# Altium footprint library pcb.PcbLib: 397 footprints (part 10 of 25)
Each footprint in its own frame and in the unit in brackets; x right, y up, seen from the top. Pads: shape width x height; smd on the part's side, far side on the other; paste and mask are expansions set on the pad; w line width, h text height; cw(c..) or ccw(c..) is an arc to the next point about the centre after c.
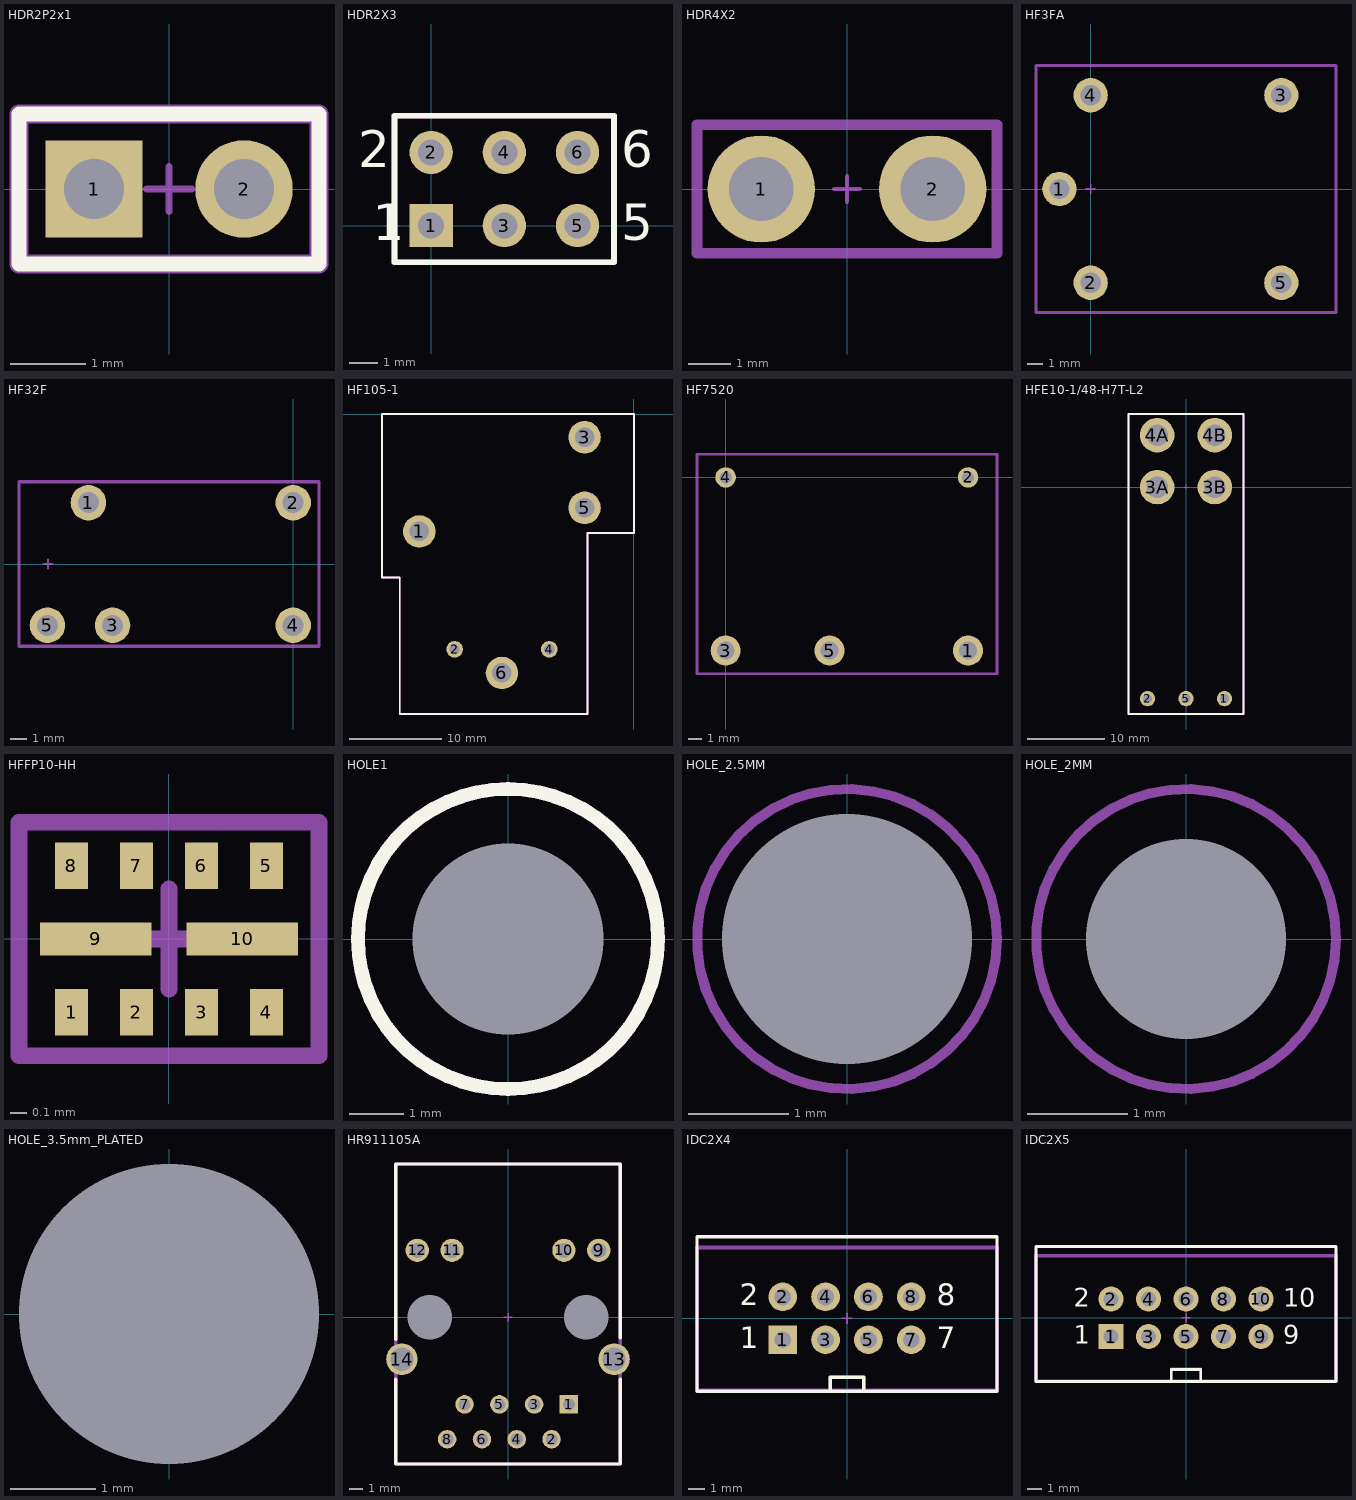
[diagram p9: the footprints below, top view; thin cyan lines are the x and y axes]

## HDR2P2x1 [mm] "Connector; Header; 2 Position"
height 2.38
pads (2):
  rect 1.3x1.3 hole 0.8: 1(-1,0)
  round 1.3 hole 0.8: 2(1,0)
Top Overlay:
  lines w0.2: -2,-1 2,-1 2,1 -2,1 -2,-1
Mechanical 15:
  lines w0.1: -0.3,0 0.3,0 ; 0,-0.3 0,0.3
  lines w0.254: -2,-1 2,-1 2,1 -2,1 -2,-1
  text ".Designator" at -1.778,-0.66 h1.02

## HDR2X3 [mm] "Connector; Header; 3x2 Position"
height 1
pads (6):
  rect 1.5x1.5 hole 0.9: 1(0,0)
  round 1.5 hole 0.9: 2(0,2.54) 3(2.54,0) 4(2.54,2.54) 5(5.08,0) 6(5.08,2.54)
Top Overlay:
  lines w0.2: 1.482,-1.27 6.35,-1.27 ; 6.35,-1.27 6.35,3.81 -1.27,3.81 -1.27,-1.27 6.35,-1.27
  text "6" at 6.604,2.032 h1.27
  text "5" at 6.604,-0.508 h1.27
  text "2" at -2.54,2.032 h1.27
  text "1" at -2.032,-0.508 h1.27
Mechanical 15:
  lines w0.1: -0.3,0 0.3,0 ; 0,-0.3 0,0.3
  lines w0.2: -1.27,-1.27 -1.27,3.81 6.35,3.81 6.35,-1.27 -1.27,-1.27
  text ".Designator" at 0,1.27 h1.02
3D body "TSW-103-05-G-D.stp": height 5.21, standoff -3.3, extent -1.26,-1.24 6.36,3.84

## HDR4X2 [mm]
height 2
pads (2):
  round 2.5 hole 1.5: 1(-2,0) 2(2,0)
Mechanical 15:
  lines w0.1: -0.3,0 0.3,0 ; 0,-0.3 0,0.3
  lines w0.254: -2.9,0 -2.5,0 ; 2.5,0 2.9,0 ; -3.5,-1.5 3.5,-1.5 3.5,1.5 -3.5,1.5 -3.5,-1.5
  text ".Designator" at -3.5,2 h1.02

## HF3FA [mm]
height 15.5
pads (5):
  round 2.2 hole 1.3: 1(-2,0) 2(0,-6) 3(12.2,6) 4(0,6) 5(12.2,-6)
Mechanical 15:
  lines w0.1: -0.3,0 0.3,0 ; 0,-0.3 0,0.3
  lines w0.2: -3.5,-7.9 15.7,-7.9 15.7,7.9 -3.5,7.9 -3.5,-7.9
  text ".Designator" at 5.3,-1.2 h1.02
3D body: height 15.5, standoff 0, extent -3.4,-7.8 15.6,7.8

## HF32F [mm]
height 15.3
pads (5):
  round 2.2 hole 1.3: 1(-12.7,3.8) 2(0,3.8) 3(-11.2,-3.8) 4(0,-3.8) 5(-15.24,-3.8)
Mechanical 15:
  lines w0.1: -15.5,0 -14.9,0 ; -15.2,-0.3 -15.2,0.3
  lines w0.2: -17,-5.1 1.6,-5.1 1.6,5.1 -17,5.1 -17,-5.1
  text ".Designator" at -9.9,-1.2 h1.02
3D body: height 15.3, standoff 0, extent -17,-5.1 1.6,5.1

## HF105-1 [mm]
height 2.38
pads (6):
  round 3.5 hole 2.1: 1(-23.1,-12.64) 3(-5.3,-2.5) 5(-5.3,-10.1) 6(-14.2,-27.88)
  round 1.8 hole 1.1: 2(-19.3,-25.34) 4(-9.1,-25.34)
Top Overlay:
  lines w0.1: -5.6,-10.1 -5,-10.1 ; -5.3,-10.4 -5.3,-9.8
  lines w0.2: -27.1,-17.6 -27.1,0 0,0 0,-12.8 -5,-12.8 -5,-32.3 -25.2,-32.3 -25.2,-17.6 -27.1,-17.6
Mechanical 15:
  lines w0.1: -5.6,-10.1 -5,-10.1 ; -5.3,-10.4 -5.3,-9.8
  lines w0.2: -27.1,-17.6 -27.1,0 0,0 0,-12.8 -5,-12.8 -5,-32.3 -25.2,-32.3 -25.2,-17.6 -27.1,-17.6
  text ".Designator" at -13.5,3.1 h1.02
3D body: height 20, standoff 0, extent -27.1,-32.3 0,0

## HF7520 [mm]
height 10.5
pads (5):
  round 2.2 hole 1.3: 1(17.78,-12.7) 3(0,-12.7) 5(7.62,-12.7)
  round 1.5 hole 0.9: 2(17.78,0) 4(0,0)
Mechanical 15:
  lines w0.1: -0.3,0 0.3,0 ; 0,-0.3 0,0.3
  lines w0.2: -2.1,-14.4 -2.1,1.7 19.9,1.7 19.9,-14.4 -2.1,-14.4
  text ".Designator" at 5.3,-7.2 h1.02
3D body: height 10.5, standoff 0, extent -2.11,-14.35 19.89,1.65

## HFE10-1/48-H7T-L2 [mm]
height 31
pads (7):
  round 2 hole 1.2: 1(5,-27.5) 2(-5,-27.5) 5(0,-27.5)
  round 4.5 hole 2.8: 3A(-3.75,0) 3B(3.75,0) 4A(-3.75,6.75) 4B(3.75,6.75)
Top Overlay:
  lines w0.254: -7.5,-29.5 -7.5,9.5 7.5,9.5 7.5,-29.5 -7.5,-29.5
Mechanical 15:
  lines w0.1: -0.3,0 0.3,0 ; 0,-0.3 0,0.3
  lines w0.254: -7.5,-29.5 7.5,-29.5 7.5,9.5 -7.5,9.5 -7.5,-29.5
  text ".Designator" at -5,-6 h1.02
3D body: height 31, standoff 0, extent -7.5,-29.5 7.5,9.5

## HFFP10-HH [mm]
height 1
pads (10):
  rect 0.2x0.28 smd paste-0.02 mask+0.05: 1(-0.585,-0.44) 2(-0.195,-0.44) 3(0.195,-0.44) 4(0.585,-0.44) 5(0.585,0.44) 6(0.195,0.44) 7(-0.195,0.44) 8(-0.585,0.44)
  rect 0.67x0.2 smd paste-50 mask+0.05: 9(-0.44,0) 10(0.44,0)
Top Paste:
  region: 0.64,0.09 0.14,0.09 0.14,-0.09 0.64,-0.09
  rectangle: -0.64,-0.09 -0.14,0.09
Mechanical 15:
  lines w0.1: -0.3,0 0.3,0 ; 0,-0.3 0,0.3 ; -0.9,-0.7 0.9,-0.7 0.9,0.7 -0.9,0.7 -0.9,-0.7
  text ".Designator" at -0.7,-0.5 h0.76
3D body: height 1, standoff 0, extent -0.75,-0.55 0.75,0.55

## HOLE1 [mm]
pads (1):
  round 0 hole 3.5 unplated paste-25.4 mask+2.75: 0(0,0)
Top Layer keep-out:
  circle w0.254: c0,0 r2.75
Top Overlay:
  circle w0.254: c0,0 r2.75
Keep-Out Layer:
  circle w0.254: c0,0 r2.75
3D body: height 2, standoff 0, extent -2.7,-2.789 2.778,2.7

## HOLE_2.5MM [mm]
pads (1):
  round 0 hole 2.5 unplated paste-255 mask+1.25: 0(0,0)
Mechanical 15:
  circle w0.1: c0,0 r1.5

## HOLE_2MM [mm]
pads (1):
  round 0 hole 2 unplated paste-255 mask+1: 0(0,0)
Mechanical 15:
  circle w0.1: c0,0 r1.5
Mechanical 16:
  circle w0.1: c0,0 r1.5

## HOLE_3.5mm_PLATED [mm]
pads (1):
  round 0 hole 3.5 paste-25.4 mask+3: 0(0,0)
3D body: height 2, standoff 0, extent -3,-2.988 2.976,3

## HR911105A [mm]
height 13.5
pads (16):
  rect 1.35x1.35 hole 0.89: 1(4.45,-6.35)
  round 1.35 hole 0.89: 2(3.18,-8.89) 3(1.91,-6.35) 4(0.64,-8.89) 5(-0.63,-6.35) 6(-1.9,-8.89) 7(-3.17,-6.35) 8(-4.44,-8.89)
  round 1.7 hole 1.1: 9(6.625,4.9) 10(4.085,4.9) 11(-4.085,4.9) 12(-6.625,4.9)
  round 2.3 hole 1.7: 13(7.745,-3.05) 14(-7.745,-3.05)
  round 0 hole 3.25 unplated: ""(-5.715,0) ""(5.715,0)
Top Overlay:
  lines w0.254: -8.2,-4.5 -8.2,-10.7 8.2,-10.7 8.2,-4.5 ; -8.2,-1.6 -8.2,11.2 8.2,11.2 8.2,-1.5
Mechanical 15:
  lines w0.1: -0.3,0 0.3,0 ; 0,-0.3 0,0.3
  lines w0.254: -8.2,-10.7 8.2,-10.7 8.2,11.2 -8.2,11.2 -8.2,-10.7
  text ".Designator" at -5.1,-8.2 h1.02
3D body "HR911105A.STEP": height 13.5, standoff -3, extent -7.95,-10.45 7.93,10.95

## IDC2X4 [mm] "Connector; Header; 4x2 Position"
pads (8):
  rect 1.7x1.7 hole 1: 1(-3.81,-1.27)
  round 1.7 hole 1: 2(-3.81,1.27) 3(-1.27,-1.27) 4(-1.27,1.27) 5(1.27,-1.27) 6(1.27,1.27) 7(3.81,-1.27) 8(3.81,1.27)
Top Overlay:
  lines w0.2: -1,-4.318 -1,-3.5 1,-3.5 1,-4.318 ; -8.89,-4.318 8.89,-4.318 8.89,4.826 -8.89,4.826 -8.89,-4.318
  text "2" at -6.35,0.762 h1.27
  text "1" at -6.35,-1.778 h1.27
  text "7" at 5.334,-1.778 h1.27
  text "8" at 5.334,0.762 h1.27
Mechanical 15:
  lines w0.1: -0.3,0 0.3,0 ; 0,-0.3 0,0.3
  lines w0.2: -1,-4.3 -1,-3.482 1,-3.482 1,-4.3
  lines w0.254: -8.89,-4.3 8.89,-4.3 8.89,4.2 -8.89,4.2 -8.89,-4.3
  text ".Designator" at -2.1,2.1 h1.02
  text "1" at -4.4,-1.8 h1.02
3D body "TST-104-01-X-D.step": height -95.73, standoff -107.92, extent -8.89,-4.737 8.89,4.737

## IDC2X5 [mm] "Connector; Header; 5x2 Position"
pads (10):
  rect 1.7x1.7 hole 1: 1(-5.08,-1.27)
  round 1.7 hole 1: 2(-5.08,1.27) 3(-2.54,-1.27) 4(-2.54,1.27) 5(0,-1.27) 6(0,1.27) 7(2.54,-1.27) 8(2.54,1.27) 9(5.08,-1.27) 10(5.08,1.27)
Top Overlay:
  lines w0.2: -1,-4.318 -1,-3.5 1,-3.5 1,-4.318 ; -10.16,-4.318 10.16,-4.318 10.16,4.826 -10.16,4.826 -10.16,-4.318
  text "2" at -7.62,0.762 h1.27
  text "1" at -7.62,-1.778 h1.27
  text "9" at 6.604,-1.778 h1.27
  text "10" at 6.604,0.762 h1.27
Mechanical 15:
  lines w0.1: -0.3,0 0.3,0 ; 0,-0.3 0,0.3
  lines w0.2: -1,-4.3 -1,-3.482 1,-3.482 1,-4.3
  lines w0.254: -10.16,-4.3 10.16,-4.3 10.16,4.2 -10.16,4.2 -10.16,-4.3
  text "1" at -5.3,-1.7 h1.02
  text ".Designator" at -1,2 h1.02
3D body "TST-105-01-X-D.step": height 8.65, standoff -3.54, extent -10.16,-4.572 10.16,4.902